# Altium schematic symbol library SCHLIB.SchLib: 2608 symbols (part 20 of 20)
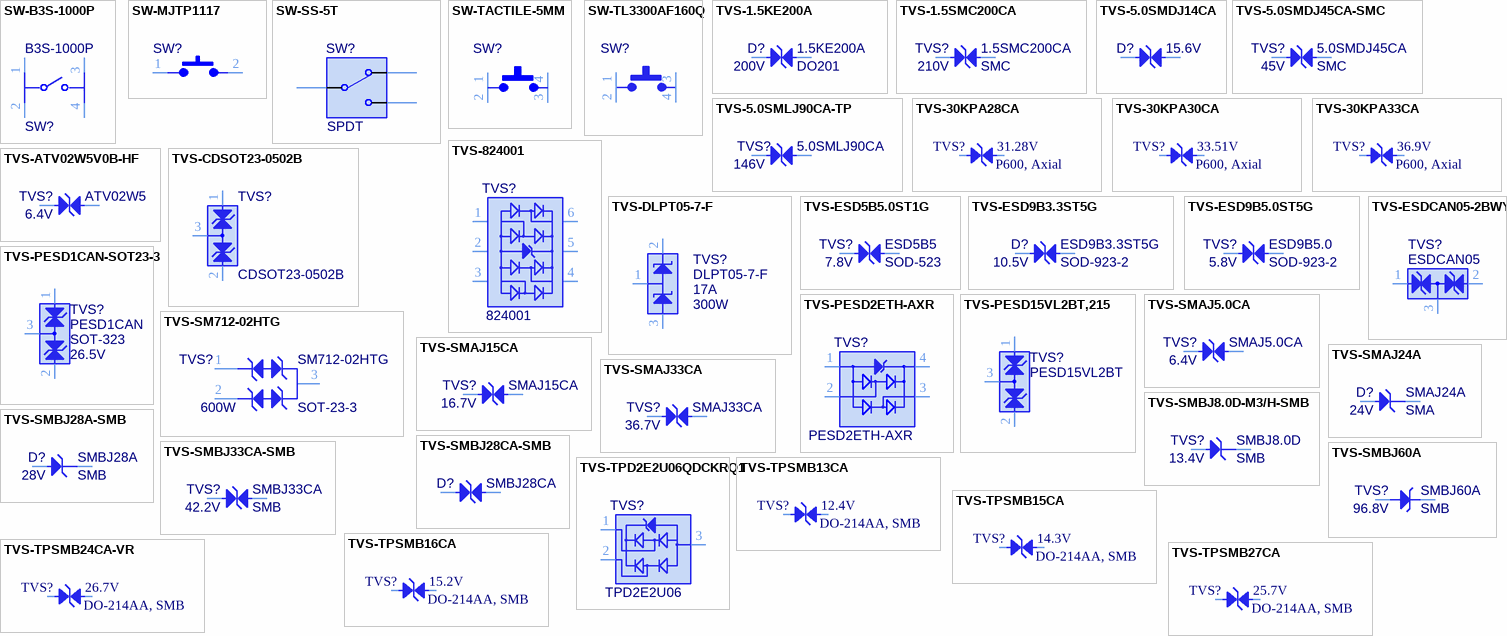
[diagram p102: symbols SW-B3S-1000P to TVS-TPSMB27CA]

## TVS-ESD9B5.0ST5G
designator TVS?, comment ESD9B5.0  Case/Package: SOD-923-2  Breakdown Voltage: 5.8V
TVS DIODE 5V SOD923; Manufacturer: ON Semiconductor; Manufacturer Part Number: ESD9B5.0ST5G; Capacitance: 15pF; Direction: Bidirectional; Number of Bidirectional Channels: 1; Power Line Protection: No; Clamping Voltage: 12.5V; Leakage Current: 1uA; Peak Pulse Current: 1A; Element Configuration: Single; Max Power Dissipation: 300mW; Test Current: 1mA; ESD Protection: Yes; Max Breakdown Voltage: 7.8V; Washability: OK; Supplier 1: Digi-Key; Supplier Part Number 1: ESD9B5.0ST5GOSCT-ND; Stock 1: 886007; Pricing 1: 1=0.14000, 10=0.12400, 100=0.05210, 500=0.04096, 1000=0.02844 (USD); RoHS: Yes; Number of Pins: 2; Contact Plating: Tin,Matte; Min Operating Temperature: -55°C; Max Operating Temperature: 150°C; Packaging: Tape and Reel; Reverse Standoff Voltage: 5V; Min Breakdown Voltage: 5.8V; Working Voltage: 5V; Number of Lines: 1; Composition: Zener; Reverse Breakdown Voltage: 5.8V; Number of Channels: 1; Number of Elements: 1; Package Quantity: 1; Operating Supply Voltage: 5V; Max Surge Current: 1A; Polarity: Bidirectional; Termination: SMD/SMT; Peak Pulse Power: 300mW; Max Reverse Leakage Current: 1uA; Length: 0.8mm; Height: 0.4mm; Depth: 0.6mm; Width: 0.65mm; Radiation Hardening: No; Lead Free: Lead Free; Halogen Free: Halogen Free; REACH SVHC: No SVHC; ComponentLink1URL: https://datasheet.ciiva.com/1219/1596367-1219274.pdf?src-supplier=Newark; ComponentLink1Description: https://datasheet.ciiva.com/1219/1596367-1219274.pdf?src-supplier=Newark; ComponentLink2URL: https://datasheet.ciiva.com/15143/getdatasheetpartid-148214-15143780.pdf?src-supplier=Verical; ComponentLink2Description: https://datasheet.ciiva.com/15143/getdatasheetpartid-148214-15143780.pdf?src-supplier=Verical; ComponentLink3URL: https://datasheet.ciiva.com/3304/esd9b-d-3304010.pdf?src-supplier=Avnet; ComponentLink3Description: https://datasheet.ciiva.com/3304/esd9b-d-3304010.pdf?src-supplier=Avnet; ComponentLink4URL: https://datasheet.ciiva.com/339/esd9b-d-339708.pdf?src-supplier=Digi-Key; ComponentLink4Description: https://datasheet.ciiva.com/339/esd9b-d-339708.pdf?src-supplier=Digi-Key; ComponentLink5URL: https://datasheet.ciiva.com/4508/esd9b-d-4508620.pdf?src-supplier=Mouser; ComponentLink5Description: https://datasheet.ciiva.com/4508/esd9b-d-4508620.pdf?src-supplier=Mouser; ComponentLink6URL: https://datasheet.ciiva.com/339/esd9b-d-339707.pdf?src-supplier=Digi-Key; ComponentLink6Description: https://datasheet.ciiva.com/339/esd9b-d-339707.pdf?src-supplier=Digi-Key; Mount: Surface Mount; Number of Unidirectional Channels: 1; ComponentLink7URL: https://datasheet.ciiva.com/6574/littelfuse-tvs-diode-smf-datasheet-pdf-6574026.pdf?src-supplier=Digi-Key; ComponentLink7Description: https://datasheet.ciiva.com/6574/littelfuse-tvs-diode-smf-datasheet-pdf-6574026.pdf?src-supplier=Digi-Key; ComponentLink8URL: https://datasheet.ciiva.com/6574/littelfuse-tvs-diode-smf-datasheet-pdf-6574025.pdf?src-supplier=Digi-Key; ComponentLink8Description: https://datasheet.ciiva.com/6574/littelfuse-tvs-diode-smf-datasheet-pdf-6574025.pdf?src-supplier=Digi-Key; ComponentLink9URL: https://datasheet.ciiva.com/6574/littelfuse-tvs-diode-smf-datasheet-pdf-6574027.pdf?src-supplier=Digi-Key; ComponentLink9Description: https://datasheet.ciiva.com/6574/littelfuse-tvs-diode-smf-datasheet-pdf-6574027.pdf?src-supplier=Digi-Key
footprint D-SOD923
pins: A, C

## TVS-ESDCAN05-2BWY
designator TVS?, comment ESDCAN05
TVS DIODE 36V 61V SOT323-3; Manufacturer: STMicroelectronics; Manufacturer Part Number: ESDCAN05-2BWY; Washability: OK; Supplier 1: Digi-Key; Stock 1: 15993; Pricing 1: 1=0.46000, 10=0.34600, 100=0.21530, 500=0.14730, 1000=0.11330 (USD); RoHS: No; ComponentLink1URL: https://www.st.com/resource/en/datasheet/esdcan06-2bwy.pdf?src-supplier=Digi-Key; ComponentLink1Description: https://www.st.com/resource/en/datasheet/esdcan06-2bwy.pdf?src-supplier=Digi-Key; Supplier Part Number 1: 497-17303-1-ND
footprint SOT323-3
pins: 1 I/O1, 2 I/O2, 3 GND (power)

## TVS-PESD1CAN-SOT23-3
designator TVS?, comment PESD1CAN  Reverse Standoff Voltage: 26.5V  Case/Package: SOT-323
TVS DIODE 24V 70V SOT23; Manufacturer: Nexperia; Manufacturer Part Number: PESD1CAN,215; Number of Bidirectional Channels: 2; Min Breakdown Voltage: 28V; Clamping Voltage: 53V; Peak Pulse Power: 150W; Power Line Protection: No; Direction: Bidirectional; Capacitance: 11pF; Element Configuration: Dual; Peak Pulse Current: 3A; Washability: OK; Supplier 1: Digi-Key; Supplier Part Number 1: 1727-3817-6-ND; Stock 1: 3225; Pricing 1: 1=0.49, 10=0.369, 100=0.2301, 500=0.15746, 1000=0.12113 (USD); Supplier 2: Digi-Key; Supplier Part Number 2: 1727-1306-1-ND; Stock 2: 0; Pricing 2: 1=0.38, 10=0.31, 100=0.2111, 500=0.15834, 1000=0.11875 (USD); Supplier 3: Digi-Key; Supplier Part Number 3: 1727-2672-1-ND; Stock 3: 15108; Pricing 3: 1=0.42, 10=0.319, 100=0.1985, 500=0.13582, 1000=0.10448 (USD); Mount: Surface Mount; Number of Pins: 3; Min Operating Temperature: -55°C; Max Operating Temperature: 150°C; Packaging: Tape and Reel; Composition: Zener; Working Voltage: 26.5V
footprint SOT23-3
pins: 1 I/O1, 2 I/O2, 3 GND (power)

## TVS-PESD2ETH-AXR
designator TVS?, comment PESD2ETH-AXR
TVS DIODE 5.5V SOT143B; Manufacturer: Nexperia; Supplier 1: Digi-Key; Supplier Part Number 1: 1727-2671-1-ND; Manufacturer Part Number: PESD2ETH-AXR; Stock: 6756; Pricing: 1=0.43, 10=0.345, 100=0.2709, 500=0.1872, 1000=0.1478 (USD); RoHS: No; ComponentLink1URL: http://www.farnell.com/datasheets/2043691.pdf?src-supplier=Farnell; ComponentLink1Description: http://www.farnell.com/datasheets/2043691.pdf?src-supplier=Farnell; ComponentLink2URL: https://assets.nexperia.com/documents/data-sheet/PESD2ETH-AX.pdf?src-supplier=Digi-Key; ComponentLink2Description: https://assets.nexperia.com/documents/data-sheet/PESD2ETH-AX.pdf?src-supplier=Digi-Key; ComponentLink3URL: http://www.farnell.com/datasheets/2043691.pdf?src-supplier=Element14; ComponentLink3Description: http://www.farnell.com/datasheets/2043691.pdf?src-supplier=Element14
footprint SOT143B
pins: 1 GND, 2 I/O1, 3 I/O2, 4 VDD

## TVS-PESD15VL2BT,215
designator TVS?, comment PESD15VL2BT
TVS DIODE 15V 44V SOT23; Manufacturer: Nexperia; Manufacturer Part Number: PESD15VL2BT,215; Supplier 1: Digi-Key; Supplier Part Number 1: 1727-3813-1-ND; Stock: 63222; Pricing: 1=0.45, 10=0.308, 100=0.182, 500=0.1232, 1000=0.0924 (USD); RoHS: No; ComponentLink1URL: https://assets.nexperia.com/documents/data-sheet/PESDXL2BT_SER.pdf?src-supplier=Digi-Key; ComponentLink1Description: https://assets.nexperia.com/documents/data-sheet/PESDXL2BT_SER.pdf?src-supplier=Digi-Key
footprint SOT23-3
pins: 1 I/O1, 2 I/O2, 3 GND (power)

## TVS-SM712-02HTG
designator TVS?, comment SM712-02HTG  Case/Package: SOT-23-3  Max Power Dissipation: 600W
TVS DIODE 12V 7V SOT23-3; Manufacturer: Littelfuse; Number of Bidirectional Channels: 2; Min Breakdown Voltage: 13.3V; Clamping Voltage: 31V; Power Line Protection: No; Direction: Bidirectional; Leakage Current: 20uA; Capacitance: 75pF; Element Configuration: Dual; Max Surge Current: 19A; Washability: OK; Supplier 1: Digi-Key; Manufacturer Part Number: SM712-02HTG; Stock 1: 103810; Pricing 1: 1=0.87, 10=0.757, 25=0.6704, 100=0.584, 250=0.50832, 500=0.4326, 1000=0.34608 (USD); Mount: Surface Mount; Number of Pins: 3; Min Operating Temperature: -40°C; Max Operating Temperature: 125°C; Packaging: Tape and Reel; Reverse Standoff Voltage: 12V; Peak Pulse Power: 600W; Working Voltage: 12V; Polarity: Bidirectional; Termination: SMD/SMT; Number of Channels: 2; Breakdown Voltage: 13.3V; Package Quantity: 3000; Peak Pulse Current: 19A; Composition: Zener; Length: 3.04mm; Depth: 1.4mm; Radiation Hardening: No; Lead Free: Lead Free; Supplier Part Number 1: F6450DKR-ND
footprint SOT23-3
pins: 1, 2, 3

## TVS-SMAJ5.0CA
designator TVS?, comment SMAJ5.0CA  Reverse Breakdown Voltage: 6.4V
TVS DIODE 5V 9.2V DO214AC; Manufacturer: Littelfuse; Direction: Bidirectional; Max Surge Current: 43.5A; Number of Elements: 1; Peak Pulse Power: 400W; Power Line Protection: No; Test Current: 10mA; Max Reverse Leakage Current: 800uA; Max Breakdown Voltage: 7V; Element Configuration: Single; Leakage Current: 1.6mA; Capacitance: 1.05nF; Washability: OK; Supplier 1: Digi-Key; Manufacturer Part Number: SMAJ5.0CA; Stock 1: 15916; Pricing 1: 1=0.45000, 10=0.33900, 25=0.30520, 100=0.21090, 250=0.17760, 500=0.14430, 1000=0.11100, 2500=0.09990 (USD); RoHS: Yes; Mount: Surface Mount; Number of Pins: 2; Min Operating Temperature: -65°C; Max Operating Temperature: 150°C; Package Quantity: 5000; Packaging: Tape and Reel; Operating Supply Voltage: 5V; Number of Bidirectional Channels: 1; Reverse Standoff Voltage: 5V; Min Breakdown Voltage: 6.4V; Clamping Voltage: 9.2V; Breakdown Voltage: 6.4V; Number of Channels: 1; Polarity: Bidirectional; Termination: SMD/SMT; Peak Pulse Current: 43.5A; Power Dissipation: 400W; Max Power Dissipation: 400W; Voltage Rating (DC): 5V; Max Output Current: 43.5A; Composition: Zener; Length: 4.5mm; Height: 2.087mm; Width: 2.79mm; Radiation Hardening: No; REACH SVHC: No SVHC; Lead Free: Lead Free; ComponentLink1URL: https://datasheet.ciiva.com/25624/0900766b810f4edb-25624837.pdf?src-supplier=RSComponents; ComponentLink1Description: https://datasheet.ciiva.com/25624/0900766b810f4edb-25624837.pdf?src-supplier=RSComponents; ComponentLink2URL: https://datasheet.ciiva.com/331/littelfuse-tvs-diode-smaj-datasheet-pdf-331056.pdf?src-supplier=Digi-Key; ComponentLink2Description: https://datasheet.ciiva.com/331/littelfuse-tvs-diode-smaj-datasheet-pdf-331056.pdf?src-supplier=Digi-Key; ComponentLink3URL: https://datasheet.ciiva.com/16206/littelfuse-tvs-diode-smaj-16206104.pdf?src-supplier=Future+Electronics; ComponentLink3Description: https://datasheet.ciiva.com/16206/littelfuse-tvs-diode-smaj-16206104.pdf?src-supplier=Future+Electronics; ComponentLink4URL: https://datasheet.ciiva.com/331/littelfuse-tvs-diode-smaj-datasheet-pdf-331054.pdf?src-supplier=Digi-Key; ComponentLink4Description: https://datasheet.ciiva.com/331/littelfuse-tvs-diode-smaj-datasheet-pdf-331054.pdf?src-supplier=Digi-Key; ComponentLink5URL: https://datasheet.ciiva.com/28473/607617-28473438.pdf?src-supplier=Element14; ComponentLink5Description: https://datasheet.ciiva.com/28473/607617-28473438.pdf?src-supplier=Element14; ComponentLink6URL: https://datasheet.ciiva.com/331/littelfuse-tvs-diode-smaj-datasheet-pdf-331055.pdf?src-supplier=Digi-Key; ComponentLink6Description: https://datasheet.ciiva.com/331/littelfuse-tvs-diode-smaj-datasheet-pdf-331055.pdf?src-supplier=Digi-Key; Supplier Part Number 1: SMAJ5.0CALFCT-ND
footprint D-SMA-DO214AC-CA
pins: A, C

## TVS-SMAJ15CA
designator TVS?, comment SMAJ15CA  Min Breakdown Voltage: 16.7V
TVS DIODE 15V 24.4V DO214AC; Manufacturer: Littelfuse; Power Dissipation: 400W; Number of Elements: 1; Element Configuration: Single; Leakage Current: 1uA; Polarity: Bidirectional; Power Line Protection: No; Peak Pulse Current: 16.4A; Test Current: 1mA; Max Breakdown Voltage: 18.5V; Max Power Dissipation: 3.3W; Supplier 1: Digi-Key; Supplier Part Number 1: SMAJ15CALFCT-ND; Manufacturer Part Number: SMAJ15CA; Stock: 47858; Pricing: 1=0.41, 10=0.275, 100=0.1625, 500=0.11, 1000=0.0825 (USD); RoHS: Yes; Mount: Surface Mount; Number of Pins: 2; Min Operating Temperature: -65°C; Max Operating Temperature: 150°C; Packaging: Tape and Reel; Voltage Rating (DC): 15V; Package Quantity: 5000; Reverse Breakdown Voltage: 16.7V; Composition: Zener; Number of Channels: 1; Breakdown Voltage: 16.7V; Clamping Voltage: 24.4V; Peak Pulse Power: 400W; Termination: SMD/SMT; Number of Bidirectional Channels: 1; Reverse Standoff Voltage: 15V; Max Reverse Leakage Current: 1uA; Direction: Bidirectional; Operating Supply Voltage: 15V; Max Surge Current: 16.4A; Length: 4.5mm; Height: 2.087mm; Width: 2.79mm; Radiation Hardening: No; REACH SVHC: No SVHC; Lead Free: Lead Free; ComponentLink1URL: https://datasheet.ciiva.com/25624/0900766b810f4edb-25624840.pdf?src-supplier=RSComponents; ComponentLink1Description: https://datasheet.ciiva.com/25624/0900766b810f4edb-25624840.pdf?src-supplier=RSComponents; ComponentLink2URL: https://datasheet.ciiva.com/331/littelfuse-tvs-diode-smaj-datasheet-pdf-331084.pdf?src-supplier=Digi-Key; ComponentLink2Description: https://datasheet.ciiva.com/331/littelfuse-tvs-diode-smaj-datasheet-pdf-331084.pdf?src-supplier=Digi-Key; ComponentLink3URL: https://datasheet.ciiva.com/28473/607617-28473388.pdf?src-supplier=Element14; ComponentLink3Description: https://datasheet.ciiva.com/28473/607617-28473388.pdf?src-supplier=Element14; ComponentLink4URL: https://datasheet.ciiva.com/331/littelfuse-tvs-diode-smaj-datasheet-pdf-331085.pdf?src-supplier=Digi-Key; ComponentLink4Description: https://datasheet.ciiva.com/331/littelfuse-tvs-diode-smaj-datasheet-pdf-331085.pdf?src-supplier=Digi-Key; ComponentLink5URL: https://datasheet.ciiva.com/331/littelfuse-tvs-diode-smaj-datasheet-pdf-331086.pdf?src-supplier=Digi-Key; ComponentLink5Description: https://datasheet.ciiva.com/331/littelfuse-tvs-diode-smaj-datasheet-pdf-331086.pdf?src-supplier=Digi-Key; ComponentLink6URL: https://datasheet.ciiva.com/16487/littelfuse-tvs-diode-smaj-16487445.pdf?src-supplier=Future+Electronics; ComponentLink6Description: https://datasheet.ciiva.com/16487/littelfuse-tvs-diode-smaj-16487445.pdf?src-supplier=Future+Electronics; ComponentLink7URL: https://datasheet.ciiva.com/8062/littelfuse-tvs-diode-smaj-8062270.pdf?src-supplier=Element14; ComponentLink7Description: https://datasheet.ciiva.com/8062/littelfuse-tvs-diode-smaj-8062270.pdf?src-supplier=Element14
footprint D-SMA-DO214AC-CA
pins: A, C

## TVS-SMAJ24A
designator D?, comment SMAJ24A  Package: SMA  Operating Supply Voltage: 24V
TVS DIODE 24VWM 38.9VC SMA; Manufacturer: Littelfuse; Max Surge Current: 10.3A; Number of Elements: 1; Reverse Breakdown Voltage: 26.7V; Clamping Voltage: 38.9V; Polarity: Unidirectional; Peak Pulse Power: 400W; Test Current: 1mA; Leakage Current: 1uA; Power Line Protection: No; Element Configuration: Single; Max Breakdown Voltage: 29.5V; Capacitance: 650pF; Forward Voltage: 5V; Washability: OK; Supplier 1: Digi-Key; Manufacturer Part Number: SMAJ24A; Stock 1: 53618; Pricing 1: 1=0.5, 10=0.355, 25=0.2916, 100=0.2334, 250=0.16972, 500=0.1379, 1000=0.10607, 2500=0.09546 (USD); Mount: Surface Mount; Number of Pins: 2; Min Operating Temperature: -65°C; Max Operating Temperature: 150°C; Package Quantity: 5000; Packaging: Tape and Reel; Breakdown Voltage: 26.7V; Reverse Standoff Voltage: 24V; Min Breakdown Voltage: 26.7V; Peak Pulse Current: 10.3A; Direction: Unidirectional; Number of Unidirectional Channels: 1; Max Reverse Leakage Current: 1uA; Max Power Dissipation: 400W; Composition: Zener; Number of Channels: 1; Termination: SMD/SMT; Voltage Rating (DC): 24V; Power Dissipation: 400W; Max Output Current: 10.3A; Length: 4.5mm; Height: 2.087mm; Width: 2.79mm; Radiation Hardening: No; REACH SVHC: No SVHC; Lead Free: Lead Free; ComponentLink1URL: http://www.littelfuse.com/~/media/electronics/datasheets/tvs_diodes/littelfuse_tvs_diode_smaj_datasheet.pdf.pdf; ComponentLink1Description: http://www.littelfuse.com/~/media/electronics/datasheets/tvs_diodes/littelfuse_tvs_diode_smaj_datasheet.pdf.pdf; ComponentLink2URL: http://www.farnell.com/datasheets/607617.pdf; ComponentLink2Description: http://www.farnell.com/datasheets/607617.pdf; ComponentLink3URL: http://www.littelfuse.com/data/en/Data_Sheets/Littelfuse_TVS-Diode_SMAJ.pdf; ComponentLink3Description: http://www.littelfuse.com/data/en/Data_Sheets/Littelfuse_TVS-Diode_SMAJ.pdf; ComponentLink4URL: https://www.verical.com/server-webapp/html/getDatasheet?partID=120907; ComponentLink4Description: https://www.verical.com/server-webapp/html/getDatasheet?partID=120907; Supplier Part Number 1: SMAJ24ALFDKR-ND
footprint D-SMA-DO214AC
pins: A, C

## TVS-SMAJ33CA
designator TVS?, comment SMAJ33CA  Reverse Breakdown Voltage: 36.7V
TVS DIODE 33V 53.3V DO214AC; Manufacturer: Littelfuse; Direction: Bidirectional; Max Surge Current: 7.5A; Number of Channels: 1; Peak Pulse Power: 400W; Power Line Protection: No; Max Breakdown Voltage: 40.6V; Test Current: 1mA; Max Power Dissipation: 3.3W; Leakage Current: 1uA; Supplier 1: Digi-Key; Supplier Part Number 1: SMAJ33CALFCT-ND; Manufacturer Part Number: SMAJ33CA; Stock: 28291; Pricing: 1=0.41, 10=0.275, 100=0.1625, 500=0.11, 1000=0.0825 (USD); RoHS: Yes; Mount: Surface Mount; Number of Pins: 2; Min Operating Temperature: -65°C; Max Operating Temperature: 150°C; Packaging: Tape and Reel; Package Quantity: 5000; Operating Supply Voltage: 33V; Breakdown Voltage: 36.7V; Clamping Voltage: 53.3V; Polarity: Bidirectional; Termination: SMD/SMT; Number of Bidirectional Channels: 1; Min Breakdown Voltage: 36.7V; Number of Elements: 1; Peak Pulse Current: 7.5A; Power Dissipation: 400W; Voltage Rating (DC): 33V; Composition: Zener; Length: 5.28mm; Height: 2.29mm; Width: 2.79mm; REACH SVHC: No SVHC; Lead Free: Lead Free; ComponentLink1URL: https://datasheet.ciiva.com/331/littelfuse-tvs-diode-smaj-datasheet-pdf-331111.pdf?src-supplier=Digi-Key; ComponentLink1Description: https://datasheet.ciiva.com/331/littelfuse-tvs-diode-smaj-datasheet-pdf-331111.pdf?src-supplier=Digi-Key; ComponentLink2URL: https://datasheet.ciiva.com/331/littelfuse-tvs-diode-smaj-datasheet-pdf-331112.pdf?src-supplier=Digi-Key; ComponentLink2Description: https://datasheet.ciiva.com/331/littelfuse-tvs-diode-smaj-datasheet-pdf-331112.pdf?src-supplier=Digi-Key; ComponentLink3URL: https://datasheet.ciiva.com/16487/littelfuse-tvs-diode-smaj-16487784.pdf?src-supplier=Future+Electronics; ComponentLink3Description: https://datasheet.ciiva.com/16487/littelfuse-tvs-diode-smaj-16487784.pdf?src-supplier=Future+Electronics; ComponentLink4URL: https://datasheet.ciiva.com/331/littelfuse-tvs-diode-smaj-datasheet-pdf-331113.pdf?src-supplier=Digi-Key; ComponentLink4Description: https://datasheet.ciiva.com/331/littelfuse-tvs-diode-smaj-datasheet-pdf-331113.pdf?src-supplier=Digi-Key; ComponentLink5URL: https://datasheet.ciiva.com/28473/607617-28473417.pdf?src-supplier=Element14; ComponentLink5Description: https://datasheet.ciiva.com/28473/607617-28473417.pdf?src-supplier=Element14; Reverse Standoff Voltage: 33V
footprint D-SMA-DO214AC-CA
pins: A, C

## TVS-SMBJ8.0D-M3/H-SMB
designator TVS?, comment SMBJ8.0D  Clamping Voltage: 13.4V  Case/Package: SMB
TVS DIODE 8V 13.4V DO214AA; Manufacturer: Vishay Semiconductors; Manufacturer Part Number: SMBJ8.0D-M3/H; Number of Unidirectional Channels: 1; Min Breakdown Voltage: 9.03V; Peak Pulse Power: 600W; Power Line Protection: No; Peak Pulse Current: 44.8A; Washability: OK; Polarity: Bidirectional; Max Breakdown Voltage: 50.3V; Supplier 1: Digi-Key; Stock 1: 7512; Pricing 1: 1=0.37, 10=0.3, 25=0.2744, 100=0.2042, 250=0.18504 (USD); Mount: Surface Mount; Min Operating Temperature: -55°C; Max Operating Temperature: 150°C; Packaging: Tape and Reel; Reverse Standoff Voltage: 8V; Composition: Zener; Supplier Part Number 1: SMBJ8.0D-M3/HGIDKR-ND; Stock: 935; Pricing: 1=0.27, 10=0.252, 100=0.2258, 500=0.1974 (USD); RoHS: Yes; Number of Pins: 2; Number of Bidirectional Channels: 1; REACH SVHC: Unknown; ComponentLink1URL: http://www.farnell.com/datasheets/2036376.pdf?src-supplier=Element14; ComponentLink1Description: http://www.farnell.com/datasheets/2036376.pdf?src-supplier=Element14
footprint D-SMB-DO214AA
pins: 1 I/O1, 2 I/O2

## TVS-SMBJ28A-SMB
designator D?, comment SMBJ28A  Case/Package: SMB  Operating Supply Voltage: 28V
TVS DIODE 28VWM 45.4VC SMB; Manufacturer: Littelfuse; Min Breakdown Voltage: 31.1V; Clamping Voltage: 45.4V; Peak Pulse Power: 600W; Peak Pulse Current: 13.3A; Test Current: 1mA; Direction: Unidirectional; Number of Elements: 1; Max Reverse Leakage Current: 1uA; Element Configuration: Single; Max Breakdown Voltage: 34.4V; Power Line Protection: No; Max Output Current: 13.2A; Capacitance: 110pF; Washability: OK; Supplier 1: Digi-Key; Supplier Part Number 1: SMBJ28ALFDKR-ND; Manufacturer Part Number: SMBJ28A; Stock 1: 199453; Pricing 1: 1=0.46, 10=0.363, 25=0.3056, 100=0.2488, 250=0.20616, 500=0.17062, 1000=0.12797 (USD); Mount: Surface Mount; Number of Pins: 2; Min Operating Temperature: -65°C; Max Operating Temperature: 150°C; Packaging: Tape and Reel; Reverse Standoff Voltage: 28V; Breakdown Voltage: 31.1V; Package Quantity: 3000; Reverse Breakdown Voltage: 31.1V; Max Surge Current: 13.3A; Polarity: Unidirectional; Leakage Current: 1uA; Max Power Dissipation: 600W; Termination: SMD/SMT; Number of Unidirectional Channels: 1; Number of Channels: 1; Voltage Rating (DC): 28V; Composition: Zener; Power Dissipation: 600W; Current: 1mA; Voltage: 28V; Length: 4.57mm; Height: 2.237mm; Width: 3.94mm; Radiation Hardening: No; Lead Free: Lead Free; REACH SVHC: No SVHC; ComponentLink1URL: http://www.littelfuse.com/~/media/electronics/datasheets/tvs_diodes/littelfuse_tvs_diode_smbj_datasheet.pdf.pdf; ComponentLink1Description: http://www.littelfuse.com/~/media/electronics/datasheets/tvs_diodes/littelfuse_tvs_diode_smbj_datasheet.pdf.pdf; ComponentLink2URL: http://www.farnell.com/datasheets/13057.pdf; ComponentLink2Description: http://www.farnell.com/datasheets/13057.pdf; Contact Plating: Matte,Tin; Number of Bidirectional Channels: 1; ESD Protection: No; ComponentLink3URL: http://www.mouser.com/ds/2/149/SMBJ28CA-197162.pdf; ComponentLink3Description: http://www.mouser.com/ds/2/149/SMBJ28CA-197162.pdf; ComponentLink4URL: https://www.verical.com/server-webapp/html/getDatasheet?partID=86693; ComponentLink4Description: https://www.verical.com/server-webapp/html/getDatasheet?partID=86693; ComponentLink5URL: http://www.fairchildsemi.com/ds/SM/SMBJ9V0CA.pdf; ComponentLink5Description: http://www.fairchildsemi.com/ds/SM/SMBJ9V0CA.pdf; ComponentLink6URL: https://www.fairchildsemi.com/package-drawings/DO/DO214AA.pdf; ComponentLink6Description: https://www.fairchildsemi.com/package-drawings/DO/DO214AA.pdf; ComponentLink7URL: http://www.fairchildsemi.com/ds/SM/SMBJ28CA.pdf; ComponentLink7Description: http://www.fairchildsemi.com/ds/SM/SMBJ28CA.pdf; ComponentLink8URL: http://www.farnell.com/datasheets/2013293.pdf; ComponentLink8Description: http://www.farnell.com/datasheets/2013293.pdf; ComponentLink9URL: http://www.farnell.com/datasheets/2041440.pdf; ComponentLink9Description: http://www.farnell.com/datasheets/2041440.pdf; Working Voltage: 28V; ComponentLink10URL: http://www.diodes.com//datasheets/ds19002.pdf; ComponentLink10Description: http://www.diodes.com//datasheets/ds19002.pdf; ComponentLink11URL: http://datasheet.iiic.cc/diodes/SMBJ28CA-13-F.pdf; ComponentLink11Description: http://datasheet.iiic.cc/diodes/SMBJ28CA-13-F.pdf
footprint D-SMB-DO214AA
pins: A, C

## TVS-SMBJ28CA-SMB
designator D?, comment SMBJ28CA
TVS DIODE 28VWM 45.4VC SMB BiDirectional; Manufacturer: Littelfuse; Clamping Voltage: 45.4V; Peak Pulse Power: 600W; Reverse Standoff Voltage: 28V; Peak Pulse Current: 13.3A; Test Current: 1mA; Reverse Breakdown Voltage: 31.1V; Number of Elements: 1; Leakage Current: 1uA; Element Configuration: Single; Power Line Protection: No; Max Power Dissipation: 5W; Max Breakdown Voltage: 34.4V; Washability: OK; ComponentLink1URL: https://www.diodes.com/assets/Datasheets/SBR1045SD1.pdf; ComponentLink1Description: https://www.diodes.com/assets/Datasheets/SBR1045SD1.pdf; ComponentLink2URL: http://www.mouser.com/ds/2/115/SBR1045SD1-464814.pdf; ComponentLink2Description: http://www.mouser.com/ds/2/115/SBR1045SD1-464814.pdf; ComponentLink3URL: http://www.littelfuse.com/data/en/Data_Sheets/Littelfuse_TVS-Diode_SMBJ.pdf; ComponentLink3Description: http://www.littelfuse.com/data/en/Data_Sheets/Littelfuse_TVS-Diode_SMBJ.pdf; ComponentLink4URL: https://www.distrelec.biz/Web/Downloads/g_/ds/smbj_eng_ds.pdf?mime=application%2Fpdf; ComponentLink4Description: https://www.distrelec.biz/Web/Downloads/g_/ds/smbj_eng_ds.pdf?mime=application%2Fpdf; ComponentLink5URL: http://www.littelfuse.com/~/media/electronics/datasheets/tvs_diodes/littelfuse_tvs_diode_smbj_datasheet.pdf.pdf; ComponentLink5Description: http://www.littelfuse.com/~/media/electronics/datasheets/tvs_diodes/littelfuse_tvs_diode_smbj_datasheet.pdf.pdf; ComponentLink6URL: http://www.diodes.com//datasheets/ds19002.pdf; ComponentLink6Description: http://www.diodes.com//datasheets/ds19002.pdf; ComponentLink7URL: http://datasheet.iiic.cc/diodes/SMBJ28CA-13-F.pdf; ComponentLink7Description: http://datasheet.iiic.cc/diodes/SMBJ28CA-13-F.pdf; ComponentLink8URL: http://www.bourns.com/data/global/pdfs/SMBJ.pdf; ComponentLink8Description: http://www.bourns.com/data/global/pdfs/SMBJ.pdf; ComponentLink9URL: https://www.bourns.com/docs/Product-Datasheets/SMBJ.pdf; ComponentLink9Description: https://www.bourns.com/docs/Product-Datasheets/SMBJ.pdf; ComponentLink10URL: http://www.bourns.com/docs/Product-Datasheets/SMBJ.pdf; ComponentLink10Description: http://www.bourns.com/docs/Product-Datasheets/SMBJ.pdf; Supplier 1: Digi-Key; Manufacturer Part Number: SMBJ28CA; Stock 1: 35357; Pricing 1: 1=0.45000, 10=0.35700, 25=0.30080, 100=0.24480, 250=0.20280, 500=0.16784, 1000=0.12587 (USD); RoHS: Yes; Mount: Surface Mount; Case/Package: SMB; Number of Pins: 2; Weight: 0.00328oz; Min Operating Temperature: -65°C; Max Operating Temperature: 150°C; Packaging: Tape and Reel; Polarity: Bidirectional; Min Breakdown Voltage: 31.1V; Package Quantity: 3000; Breakdown Voltage: 31.1V; Max Surge Current: 13.3A; Direction: Bidirectional; Operating Supply Voltage: 28V; Max Reverse Leakage Current: 1uA; Number of Channels: 1; Number of Bidirectional Channels: 1; Composition: Zener; Termination: SMD/SMT; Power Dissipation: 600W; Voltage Rating (DC): 28V; Length: 4.57mm; Height: 2.237mm; Width: 3.94mm; Lead Free: Lead Free; REACH SVHC: Unknown; ComponentLink11URL: https://datasheet.ciiva.com/8062/littelfuse-tvs-diode-smbj-8062326.pdf?src-supplier=Element14; ComponentLink11Description: https://datasheet.ciiva.com/8062/littelfuse-tvs-diode-smbj-8062326.pdf?src-supplier=Element14; ComponentLink12URL: https://datasheet.ciiva.com/14162/smbj-eng-ds-14162027.pdf?src-supplier=Distrelec; ComponentLink12Description: https://datasheet.ciiva.com/14162/smbj-eng-ds-14162027.pdf?src-supplier=Distrelec; ComponentLink13URL: https://datasheet.ciiva.com/331/littelfuse-tvs-diode-smbj-datasheet-pdf-331532.pdf?src-supplier=Digi-Key; ComponentLink13Description: https://datasheet.ciiva.com/331/littelfuse-tvs-diode-smbj-datasheet-pdf-331532.pdf?src-supplier=Digi-Key; ComponentLink14URL: https://datasheet.ciiva.com/331/littelfuse-tvs-diode-smbj-datasheet-pdf-331533.pdf?src-supplier=Digi-Key; ComponentLink14Description: https://datasheet.ciiva.com/331/littelfuse-tvs-diode-smbj-datasheet-pdf-331533.pdf?src-supplier=Digi-Key; ComponentLink15URL: https://datasheet.ciiva.com/331/littelfuse-tvs-diode-smbj-datasheet-pdf-331534.pdf?src-supplier=Digi-Key; ComponentLink15Description: https://datasheet.ciiva.com/331/littelfuse-tvs-diode-smbj-datasheet-pdf-331534.pdf?src-supplier=Digi-Key; Supplier 2: Digi-Key; Stock 2: 2201; Pricing 2: 1=0.54000, 10=0.38000, 25=0.31160, 100=0.24930, 250=0.18128, 500=0.14730, 1000=0.11330 (USD); Radiation Hardening: No; ComponentLink16URL: https://datasheet.ciiva.com/333/smbj5-0-smbj440cado-214aa-333725.pdf?src-supplier=Digi-Key; ComponentLink16Description: https://datasheet.ciiva.com/333/smbj5-0-smbj440cado-214aa-333725.pdf?src-supplier=Digi-Key; ComponentLink17URL: https://datasheet.ciiva.com/333/smbj5-0-smbj440cado-214aa-333726.pdf?src-supplier=Digi-Key; ComponentLink17Description: https://datasheet.ciiva.com/333/smbj5-0-smbj440cado-214aa-333726.pdf?src-supplier=Digi-Key; ComponentLink18URL: https://datasheet.ciiva.com/333/smbj5-0-smbj440cado-214aa-333727.pdf?src-supplier=Digi-Key; ComponentLink18Description: https://datasheet.ciiva.com/333/smbj5-0-smbj440cado-214aa-333727.pdf?src-supplier=Digi-Key; Supplier 3: Digi-Key; Stock 3: 10524; Pricing 3: 1=0.46000, 10=0.37300, 100=0.25380, 500=0.19034, 1000=0.14276 (USD); Contact Plating: Tin; ESD Protection: No; ComponentLink19URL: https://datasheet.ciiva.com/16487/cd00001366-16487589.pdf?src-supplier=Future+Electronics; ComponentLink19Description: https://datasheet.ciiva.com/16487/cd00001366-16487589.pdf?src-supplier=Future+Electronics; ComponentLink20URL: https://datasheet.ciiva.com/26817/getdatasheetpartid-88957-26817766.pdf?src-supplier=Verical; ComponentLink20Description: https://datasheet.ciiva.com/26817/getdatasheetpartid-88957-26817766.pdf?src-supplier=Verical; ComponentLink21URL: https://datasheet.ciiva.com/41826/cd00001366-41826202.pdf?src-supplier=Digi-Key; ComponentLink21Description: https://datasheet.ciiva.com/41826/cd00001366-41826202.pdf?src-supplier=Digi-Key; ComponentLink22URL: https://datasheet.ciiva.com/7965/1761316-7965548.pdf?src-supplier=Element14; ComponentLink22Description: https://datasheet.ciiva.com/7965/1761316-7965548.pdf?src-supplier=Element14; ComponentLink23URL: https://datasheet.ciiva.com/7973/1761316-7973581.pdf?src-supplier=Element14; ComponentLink23Description: https://datasheet.ciiva.com/7973/1761316-7973581.pdf?src-supplier=Element14; ComponentLink24URL: https://datasheet.ciiva.com/7973/1761316-7973583.pdf?src-supplier=Element14; ComponentLink24Description: https://datasheet.ciiva.com/7973/1761316-7973583.pdf?src-supplier=Element14; Supplier Part Number 1: SMBJ28CALFCT-ND; Supplier Part Number 2: SMBJ28CA-TPMSCT-ND; Supplier Part Number 3: 497-14744-1-ND
footprint D-SMB-DO214AA-CA
pins: A, C

## TVS-SMBJ33CA-SMB
designator TVS?, comment SMBJ33CA  Case/Package: SMB  Breakdown Voltage: 42.2V
TVS DIODE 33VWM 53.3VC SMB; Manufacturer: Bourns; Clamping Voltage: 53.3V; Peak Pulse Power: 600W; Reverse Standoff Voltage: 33V; Peak Pulse Current: 11.3A; Polarity: Bidirectional; Test Current: 1mA; Max Surge Current: 100A; Min Breakdown Voltage: 36.7V; Number of Elements: 1; Leakage Current: 5uA; Operating Supply Voltage: 3.5V; Element Configuration: Single; Power Line Protection: No; ESD Protection: Yes; Washability: OK; Supplier 1: Digi-Key; Supplier Part Number 1: SMBJ33CABCT-ND; Manufacturer Part Number: SMBJ33CA; Stock 1: 22606; Pricing 1: 1=0.35000, 10=0.28700, 25=0.26240, 100=0.16490, 250=0.16304, 500=0.15266, 1000=0.10380 (USD); RoHS: Yes; Mount: Surface Mount; Number of Pins: 2; Min Operating Temperature: -55°C; Max Operating Temperature: 150°C; Packaging: Tape and Reel; Package Quantity: 1; Reverse Breakdown Voltage: 36.7V; Number of Channels: 1; Termination: SMD/SMT; Direction: Bidirectional; Max Reverse Leakage Current: 5uA; Max Power Dissipation: 600W; Number of Bidirectional Channels: 1; Max Breakdown Voltage: 42.2V; Composition: Zener; Length: 4.57mm; Height: 2.42mm; Width: 3.94mm; Radiation Hardening: No; REACH SVHC: No SVHC; ComponentLink1URL: https://datasheet.ciiva.com/25624/0900766b81122151-25624666.pdf?src-supplier=RSComponents; ComponentLink1Description: https://datasheet.ciiva.com/25624/0900766b81122151-25624666.pdf?src-supplier=RSComponents; ComponentLink2URL: https://datasheet.ciiva.com/26787/smbj33ca-26787423.pdf?src-supplier=IIIC; ComponentLink2Description: https://datasheet.ciiva.com/26787/smbj33ca-26787423.pdf?src-supplier=IIIC; ComponentLink3URL: https://datasheet.ciiva.com/3022/smbj-3022538.pdf?src-supplier=Avnet; ComponentLink3Description: https://datasheet.ciiva.com/3022/smbj-3022538.pdf?src-supplier=Avnet; ComponentLink4URL: https://datasheet.ciiva.com/8031/1677318-8031157.pdf?src-supplier=Element14; ComponentLink4Description: https://datasheet.ciiva.com/8031/1677318-8031157.pdf?src-supplier=Element14; ComponentLink5URL: https://datasheet.ciiva.com/334/smbj-334697.pdf?src-supplier=Digi-Key; ComponentLink5Description: https://datasheet.ciiva.com/334/smbj-334697.pdf?src-supplier=Digi-Key; ComponentLink6URL: https://datasheet.ciiva.com/334/smbj-334698.pdf?src-supplier=Digi-Key; ComponentLink6Description: https://datasheet.ciiva.com/334/smbj-334698.pdf?src-supplier=Digi-Key; ComponentLink7URL: https://datasheet.ciiva.com/334/smbj-334699.pdf?src-supplier=Digi-Key; ComponentLink7Description: https://datasheet.ciiva.com/334/smbj-334699.pdf?src-supplier=Digi-Key; ComponentLink8URL: https://datasheet.ciiva.com/8031/1677318-8031068.pdf?src-supplier=Element14; ComponentLink8Description: https://datasheet.ciiva.com/8031/1677318-8031068.pdf?src-supplier=Element14; ComponentLink9URL: https://datasheet.ciiva.com/16237/smbj-16237484.pdf?src-supplier=Onlinecomponents.com; ComponentLink9Description: https://datasheet.ciiva.com/16237/smbj-16237484.pdf?src-supplier=Onlinecomponents.com; ComponentLink10URL: https://datasheet.ciiva.com/28410/1677318-28410077.pdf?src-supplier=Element14; ComponentLink10Description: https://datasheet.ciiva.com/28410/1677318-28410077.pdf?src-supplier=Element14; ComponentLink11URL: https://datasheet.ciiva.com/3021/smbj-3021438.pdf?src-supplier=Avnet; ComponentLink11Description: https://datasheet.ciiva.com/3021/smbj-3021438.pdf?src-supplier=Avnet; ComponentLink12URL: https://datasheet.ciiva.com/48712/001056318-da-01-en-tvs-diode-smbj33ca-do-214aa-bou-48712570.pdf?src-supplier=Conrad; ComponentLink12Description: https://datasheet.ciiva.com/48712/001056318-da-01-en-tvs-diode-smbj33ca-do-214aa-bou-48712570.pdf?src-supplier=Conrad